# Altium footprint library Isidro_Library.PcbLib: 29 footprints (part 2 of 2)
Each footprint in its own frame and in the unit in brackets; x right, y up, seen from the top. Pads: shape width x height; smd on the part's side, far side on the other; paste and mask are expansions set on the pad; w line width, h text height; cw(c..) or ccw(c..) is an arc to the next point about the centre after c.
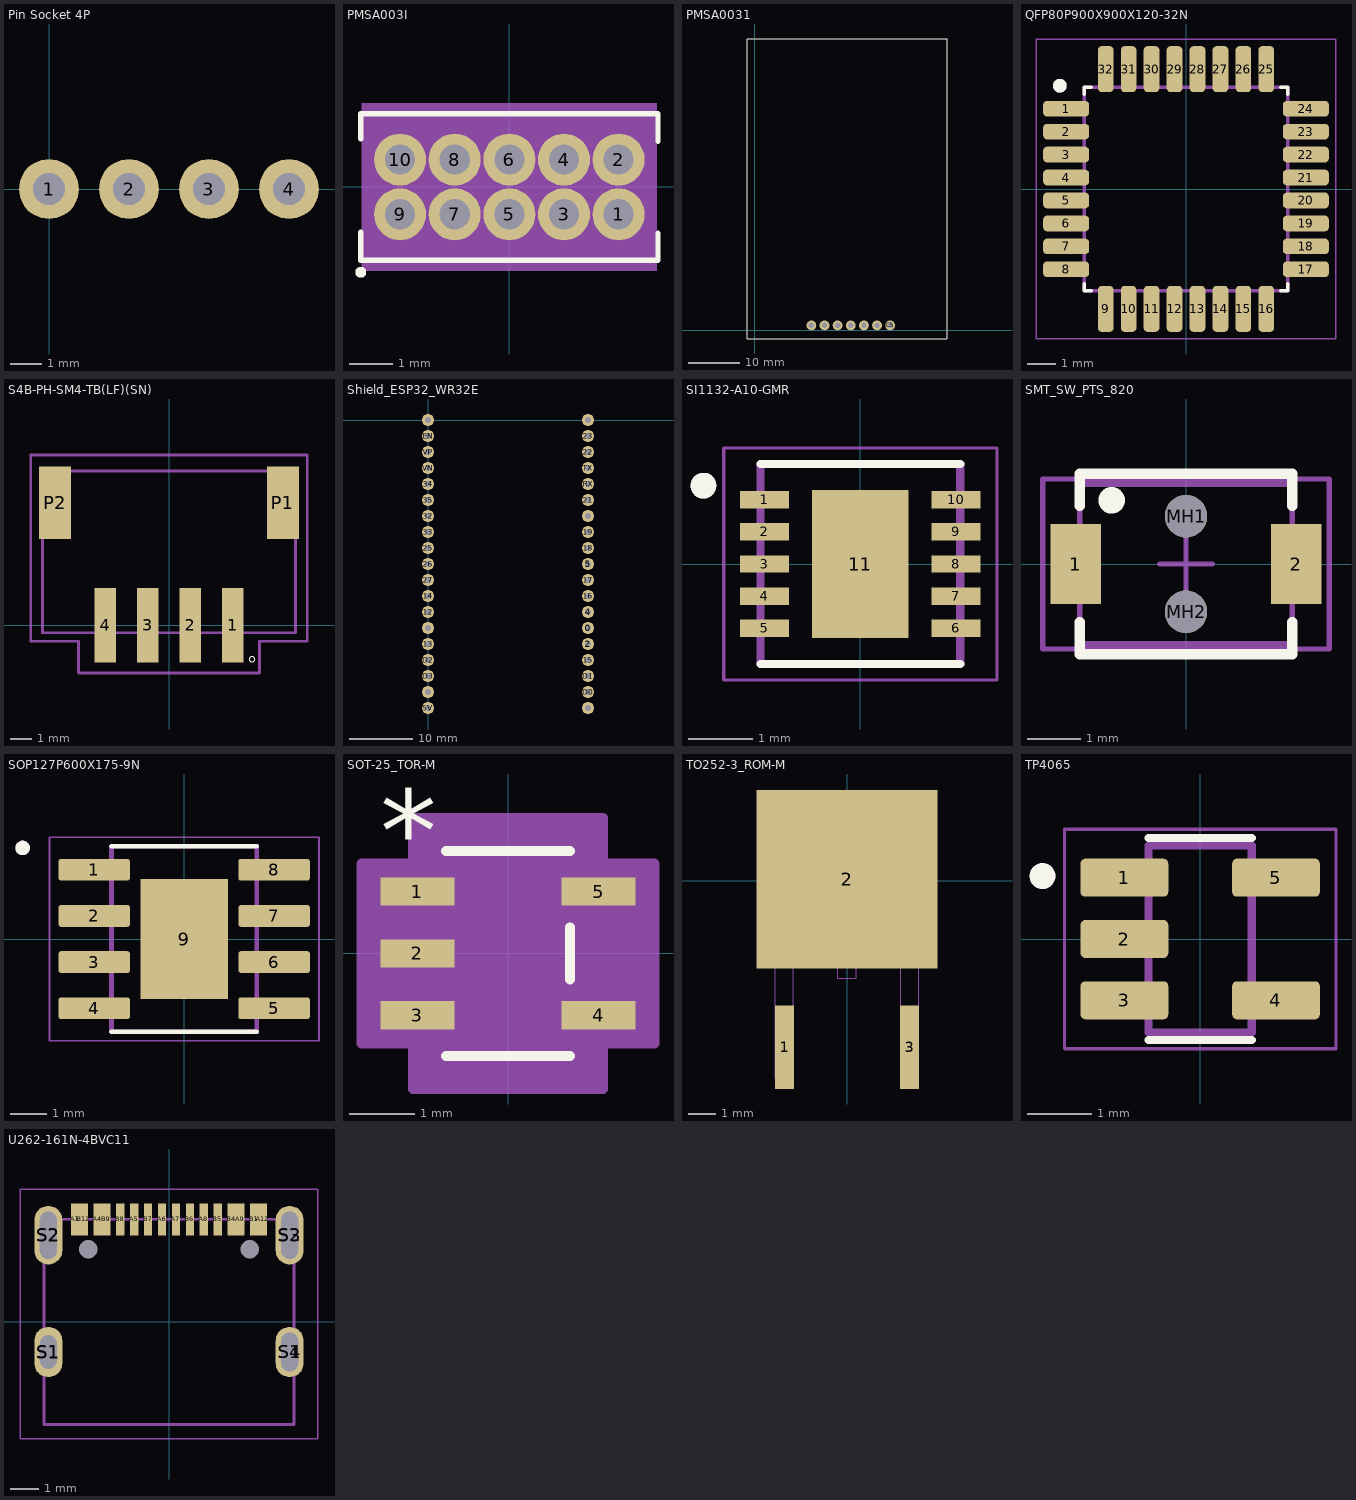
[diagram p1: the footprints below, top view; thin cyan lines are the x and y axes]

## Pin Socket 4P [mm]
pads (4):
  round 1.905 hole 1.02: 1(0,0) 2(2.54,0) 3(5.08,0) 4(7.62,0)
3D body "PinSocket_1x04_P2.54mm_Vertical.step": height 7, standoff -3.1, extent -1.27,-1.27 8.89,1.27

## PMSA003I [mm] "Sensor de particulas PM2.5/10"
pads (10):
  round 1.208 hole 0.7: 1(2.54,-0.635) 2(2.54,0.635) 3(1.27,-0.635) 4(1.27,0.635) 5(0,-0.635) 6(0,0.635) 7(-1.27,-0.635) 8(-1.27,0.635) 9(-2.54,-0.635) 10(-2.54,0.635)
Top Overlay:
  circle w0.127: c-3.454,-1.981 r0.063
  lines w0.127: -3.454,-1.05 -3.454,-1.7 3.454,-1.7 3.454,-1.08 ; -3.454,1.12 -3.454,1.7 3.454,1.7 3.454,1.06
Mechanical 13:
  lines w0.127: -3.175,-1.7 -3.175,1.7 ; 3.175,-1.7 3.175,1.7
  text "1" at -2.907,-1.101 h0.81
Mechanical 15:
  region: 3.425,-1.95 -3.425,-1.95 -3.425,1.95 3.425,1.95
3D body "PMSA003i.step": height 12.88, standoff 1.08, extent -30.43,-5.435 7.57,29.565
3D body "BB02-CN102-XBX-000000_rev1.9.STEP": height 4.85, standoff -1.85, extent -3.35,-1.562 3.35,1.538

## PMSA0031 [mm]
pads (7):
  round 1.905 hole 1.02: 3V3(13.523,0.989) CS(26.223,0.989) GND(16.063,0.989) SCK(18.603,0.989) SDI(23.683,0.989) SDO(21.143,0.989) VIN(10.983,0.989)
Top Overlay:
  lines w0.127: -1.387,56.347 -1.387,-1.653 37.135,-1.653 37.135,56.361 -1.387,56.361
3D body "PinSocket_1x07_P2.54mm_Vertical.step": height 7, standoff -3.1, extent 9.713,-0.281 27.493,2.259

## QFP80P900X900X120-32N [mm]
pads (32):
  rrect50% 1.6x0.55 smd: 1(-4.18,2.8) 2(-4.18,2) 3(-4.18,1.2) 4(-4.18,0.4) 5(-4.18,-0.4) 6(-4.18,-1.2) 7(-4.18,-2) 8(-4.18,-2.8) 17(4.18,-2.8) 18(4.18,-2) 19(4.18,-1.2) 20(4.18,-0.4) 21(4.18,0.4) 22(4.18,1.2) 23(4.18,2) 24(4.18,2.8)
  rrect50% 0.55x1.6 smd: 9(-2.8,-4.18) 10(-2,-4.18) 11(-1.2,-4.18) 12(-0.4,-4.18) 13(0.4,-4.18) 14(1.2,-4.18) 15(2,-4.18) 16(2.8,-4.18) 25(2.8,4.18) 26(2,4.18) 27(1.2,4.18) 28(0.4,4.18) 29(-0.4,4.18) 30(-1.2,4.18) 31(-2,4.18) 32(-2.8,4.18)
Top Overlay:
  circle w0.24: c-4.4,3.6 r0.12
  lines w0.127: -3.55,-3.3 -3.55,-3.55 -3.3,-3.55 ; -3.55,3.3 -3.55,3.55 -3.3,3.55 ; 3.3,-3.55 3.55,-3.55 3.55,-3.3 ; 3.3,3.55 3.55,3.55 3.55,3.3
Mechanical 13:
  circle w0.24: c-4.4,3.6 r0.12
  lines w0.127: -3.55,-3.55 -3.55,3.55 3.55,3.55 3.55,-3.55 -3.55,-3.55
Mechanical 15:
  lines w0.05: -5.23,-5.23 -5.23,5.23 5.23,5.23 5.23,-5.23 -5.23,-5.23
3D body "ATSAMD21E17A-AU.STEP": height 1.21, standoff 0.01, extent -4.5,-4.5 4.5,4.5

## S4B-PH-SM4-TB(LF)(SN) [mm] "Connector Header Surface Mount, Right Angle 4 position 0.079\" (2.00mm)"
pads (6):
  rect 1x3.5 smd: 1(3,0) 2(1,0) 3(-1,0) 4(-3,0)
  rect 1.5x3.4 smd: P1(5.35,5.75) P2(-5.35,5.75)
Top Overlay:
  circle w0: c3.9,-1.6 r0.127
Mechanical 13:
  lines w0.127: -5.95,-0.35 5.95,-0.35 5.95,7.25 -5.95,7.25 -5.95,-0.35
Mechanical 15:
  lines w0.127: -6.5,-0.75 -4.25,-0.75 -4.25,-2.25 4.25,-2.25 4.25,-0.75 6.5,-0.75 6.5,8 -6.5,8 -6.5,-0.75
3D body "S4B-PH-SM4-TB.stp": height 4.8, standoff 0, extent -5.95,-1.4 5.95,7.2

## Shield_ESP32_WR32E [mm] "Shield ESP32 WROOM 32E"
pads (38):
  round 1.905 hole 1.02: 0(25.4,-33.02) 2(25.4,-35.56) 3V3(0,0) 4(25.4,-30.48) 5(25.4,-22.86) 5V(0,-45.72) 12(0,-30.48) 13(0,-35.56) 14(0,-27.94) 15(25.4,-38.1) 16(25.4,-27.94) 17(25.4,-25.4) 18(25.4,-20.32) 19(25.4,-17.78) 21(25.4,-12.7) 22(25.4,-5.08) 23(25.4,-2.54) 25(0,-20.32) 26(0,-22.86) 27(0,-25.4) 32(0,-15.24) 33(0,-17.78) 34(0,-10.16) 35(0,-12.7) CLK(25.4,-45.72) CMD(0,-43.18) D0(25.4,-43.18) D1(25.4,-40.64) D2(0,-38.1) D3(0,-40.64) EN(0,-2.54) GND(0,-33.02) GND(25.4,-15.24) GND(25.4,0) TX(25.4,-7.62) VN(0,-7.62) VP(0,-5.08)
  round 1.905 hole 1.02 paste+0 mask+0.025: RX(25.4,-10.16)
3D body "PCB_ESP32-38Pines.step": height 13.76, standoff 3.64, extent -1.3,-50.841 26.7,4.64
3D body "PinSocket_1x19_P2.54mm_Vertical.step": height 7, standoff -3.1, extent -1.27,-46.99 1.27,1.27
3D body "PinSocket_1x19_P2.54mm_Vertical.step": height 7, standoff -3.1, extent 24.13,-46.99 26.67,1.27

## SI1132-A10-GMR [mm]
pads (11):
  rect 0.76x0.27 smd: 1(-1.485,1) 2(-1.485,0.5) 3(-1.485,0) 4(-1.485,-0.5) 5(-1.485,-1) 6(1.485,-1) 7(1.485,-0.5) 8(1.485,0) 9(1.485,0.5) 10(1.485,1)
  rect 1.5x2.3 smd paste-2: 11(0,0)
Top Overlay:
  circle w0.2: c-2.436,1.216 r0.1
  lines w0.127: -1.55,-1.55 1.55,-1.55 ; -1.55,1.55 1.55,1.55
Top Paste:
  region: 0.474,-0.727 -0.474,-0.727 -0.474,0.727 0.474,0.727
Mechanical 13:
  circle w0.2: c-2.436,1.216 r0.1
  lines w0.127: -1.55,-1.55 -1.55,1.55 1.55,1.55 1.55,-1.55 -1.55,-1.55
Mechanical 15:
  lines w0.05: -2.12,-1.8 -2.12,1.8 2.12,1.8 2.12,-1.8 -2.12,-1.8

## SMT_SW_PTS_820 [mm]
pads (4):
  rect 0.95x1.5 smd: 1(-2.075,0) 2(2.075,0)
  round 0.8 hole 0.8 unplated: MH1(0,0.9) MH2(0,-0.9)
Top Overlay:
  circle w0.25: c-1.4,1.2 r0.125
  lines w0.2: -2,-1.1 -2,-1.7 2,-1.7 2,-1.1 ; -2,1.1 -2,1.7 2,1.7 2,1.1
Mechanical 13:
  lines w0.1: -2,-1.5 2,-1.5 2,1.5 -2,1.5 -2,-1.5
Mechanical 15:
  lines w0.1: -0.5,0 0.5,0 ; 0,-0.5 0,0.5 ; -2.7,-1.6 2.7,-1.6 2.7,1.6 -2.7,1.6 -2.7,-1.6
3D body "SMT Tactile Switch PTS-820.STEP": height 2.05, standoff -0.5, extent -2.25,-1.55 2.25,1.55

## SOP127P600X175-9N [mm]
pads (9):
  rrect25% 1.97x0.6 smd: 1(-2.475,1.905) 2(-2.475,0.635) 3(-2.475,-0.635) 4(-2.475,-1.905) 5(2.475,-1.905) 6(2.475,-0.635) 7(2.475,0.635) 8(2.475,1.905)
  rect 2.413x3.302 smd paste-3: 9(0,0)
Top Overlay:
  circle w0.2: c-4.445,2.505 r0.1
  lines w0.127: -2,-2.55 2,-2.55 ; -2,2.55 2,2.55
Top Paste:
  region: 0.645,-0.82 -0.645,-0.82 -0.645,0.82 0.645,0.82
Mechanical 13:
  circle w0.2: c-4.445,2.505 r0.1
  lines w0.127: -2,-2.55 2,-2.55 2,2.55 -2,2.55 -2,-2.55
Mechanical 15:
  lines w0.05: -3.71,-2.8 3.71,-2.8 3.71,2.8 -3.71,2.8 -3.71,-2.8
3D body "TP4056--3DModel-STEP-1.STEP": height 1.7, standoff 0, extent -2.975,-2.475 3.025,2.425

## SOT-25_TOR-M [mil]
pads (5):
  rect 44.5x17 smd paste+0 mask+0: 1(-54.75,37.4) 2(-54.75,0) 3(-54.75,-37.4) 4(54.75,-37.4) 5(54.75,37.4)
Top Overlay:
  lines w6: -37.5,-62 37.5,-62 ; -37.5,62 37.5,62 ; 37.5,-15.8 37.5,15.8
  text "*" at -77.25,49.4 h50
Mechanical 13:
  lines w0: -12,57 ccw(c0,57) 12,57
  lines w1: -55,-45.9 -32.5,-45.9 -32.5,-28.9 -55,-28.9 -55,-45.9 ; -55,-8.5 -32.5,-8.5 -32.5,8.5 -55,8.5 -55,-8.5 ; -55,28.9 -32.5,28.9 -32.5,45.9 -55,45.9 -55,28.9 ; -32.5,-57 -32.5,57 32.5,57 32.5,-57 -32.5,-57 ; 32.5,-45.9 55,-45.9 55,-28.9 32.5,-28.9 32.5,-45.9 ; 32.5,28.9 55,28.9 55,45.9 32.5,45.9 32.5,28.9
  text "*" at -35,6.4 h50
Mechanical 15:
  region: 57.5,-82 -57.5,-82 -57.5,-54.4 -88.5,-54.4 -88.5,54.4 -57.5,54.4 -57.5,82 57.5,82 57.5,54.4 88.5,54.4 88.5,-54.4 57.5,-54.4
  lines w6: -88.5,-54.4 -88.5,54.4 -57.5,54.4 -57.5,82 57.5,82 57.5,54.4 88.5,54.4 88.5,-54.4 57.5,-54.4 57.5,-82 -57.5,-82 -57.5,-54.4 -88.5,-54.4
3D body "SOT-25_TOR.step": height 51.1, standoff 0, extent -55,-57.01 55,57.01

## TO252-3_ROM-M [mil]
pads (3):
  rect 28x120 smd paste+0 mask+0: 1(-90,-240) 3(90,-240)
  rect 260x257 smd paste+0 mask+0: 2(0,2)
Mechanical 13:
  lines w1: -13,-108.5 -13,-140.5 13,-140.5 13,-108.5 ; -128,-108.5 -128,108.5 128,108.5 128,-108.5 -128,-108.5 ; -103.55,-285.5 -77.55,-285.5 -77.55,-108.5 -103.55,-108.5 -103.55,-285.5 ; 77.55,-285.5 103.55,-285.5 103.55,-108.5 77.55,-108.5 77.55,-285.5
3D body "TO252-3_ROM.step": height 98.11, standoff -2.01, extent -127.99,-205 127.99,81.1

## TP4065 [mm]
pads (5):
  rrect25% 1.36x0.59 smd: 1(-1.175,0.95) 2(-1.175,0) 3(-1.175,-0.95) 4(1.175,-0.95) 5(1.175,0.95)
Top Overlay:
  circle w0.2: c-2.445,0.975 r0.1
  lines w0.127: -0.8,-1.565 0.8,-1.565 ; -0.8,1.565 0.8,1.565
Mechanical 13:
  circle w0.2: c-2.445,0.975 r0.1
  lines w0.127: -0.8,-1.45 0.8,-1.45 0.8,1.45 -0.8,1.45 -0.8,-1.45
Mechanical 15:
  lines w0.05: -2.105,-1.7 2.105,-1.7 2.105,1.7 -2.105,1.7 -2.105,-1.7
3D body "step_temp.STEP": height 1.25, standoff 0, extent -1.35,-1.45 1.35,1.45

## U262-161N-4BVC11 [mm] "USB-C"
pads (26):
  rect 0.3x1.15 smd: A1(-3.35,3.67) A4(-2.55,3.67) A5(-1.25,3.67) A6(-0.25,3.67) A7(0.25,3.67) A8(1.25,3.67) A9(2.55,3.67) A12(3.35,3.67) B1(3.05,3.67) B4(2.25,3.67) B5(1.75,3.67) B6(0.75,3.67) B7(-0.75,3.67) B8(-1.75,3.67) B9(-2.25,3.67) B12(-3.05,3.67)
  rrect100% 1x1.8 hole 1.2 slot 0.6 at 0 deg: S1(-4.32,-1.075)
  rrect100% 1x1.8 on Top Paste: S1(-4.318,-1.092) S1(4.318,-1.067)
  rrect100% 1x2.1 hole 1.7 slot 0.6 at 0 deg: S2(-4.32,3.105) S3(4.32,3.105)
  rrect100% 1x2.1 on Top Paste: S2(-4.318,3.124) S2(4.318,3.124)
  rrect100% 1x1.8 hole 1.4 slot 0.6 at 0 deg: S4(4.32,-1.075)
  round 0 / inner round 0.65 / far side round 0.65 hole 0.65: Un1(2.89,2.605) Un2(-2.89,2.605)
Mechanical 4:
  lines w0.05: -5.32,-4.18 -5.32,4.75 5.32,4.75 5.32,-4.18 -5.32,-4.18
Mechanical 6:
  lines w0.1: -4.47,-3.675 4.47,-3.675 4.47,3.675 -4.47,3.675 -4.47,-3.675
3D body "u262-16xn-4bvc11.stp": height 3.33, standoff -0.93, extent -4.45,-3.55 4.45,4.01